# Altium schematic symbol library Infineon Power MOSFET.SchLib: 1448 symbols (part 2 of 17) (continued)
## BSD316SN
designator Q?
OptiMOS 2 Small-Signal-Transistor, 30 V VDS, 1.4 A ID, PG-SOT-363, Reel, Green; Manufacturer: Infineon; PartNumber: BSD316SN; Green: TRUE; ID (max): 1.4 A; Polarity: N; RDS (on) (max): 160 mOhm; VDS (max): 30 V; DatasheetVersion: Rev. 2.4; PackageVersion: Apr-08; PackageReference: PG-SOT-363; PackageDescription: 6-Pin Small Outline Transistor Package, 2 x 1.25 mm Body, 0.65 mm Pitch; Halogen-free: TRUE; Packing: Reel; Mounting Technology: Surface Mount; ComponentLink1Description: Manufacturer URL; ComponentLink1URL: http://www.infineon.com/; ComponentLink2Description: Datasheet; ComponentLink2URL: http://www.infineon.com/dgdl/BSD316SN_Rev2.3.pdf?folderId=db3a3043156fd573011622e10b5c1f67&fileId=db3a30431add1d95011afc90c46a0521; ComponentLink3Description: Package Specification; ComponentLink3URL: http://www.infineon.com/dgdl/SOT363-Package_Overview.pdf?folderId=db3a30431936bc4b01195360bd8f3cdc&fileId=db3a30431936bc4b0119536b62bf3cf5
footprint INF-PG-SOT-363_N (SOT23, 3-Leads, Body 2x1.25mm, Pitch 0.65mm, IPC Medium Density)
footprint INF-PG-SOT-363_L (SOT23, 3-Leads, Body 2x1.25mm, Pitch 0.65mm, IPC High Density)
footprint INF-PG-SOT-363_M (SOT23, 3-Leads, Body 2x1.25mm, Pitch 0.65mm, IPC Low Density)
pins: 1 DRAIN, 2 DRAIN, 3 GATE, 4 SOURCE, 5 DRAIN, 6 DRAIN
text: 1, 2, 5, 6

## BSD816SN
designator Q?
N-Channel OptiMOS 2 Small-Signal-Transistor, 20 V VDS, 1.4 A ID, -55 to 150 degC, PG-SOT-363, Reel, Green; Manufacturer: Infineon; PartNumber: BSD816SN; Green: TRUE; ID (max): 1.4 A; IDpuls (max): 5.6 A; Ptot (max): 0.5 W; QG: 0.6 nC; RDS (on) (max): 160 mOhm; RDS (on) (max) (@1.8V): 240 mOhm; RthJA (max): 250 K/W; VDS (max): 20 V; VGS(th) (max): 0.95 V; VGS(th) (min): 0.3 V; DatasheetVersion: Rev. 2.3; PackageVersion: Apr-08; PackageReference: PG-SOT-363; PackageDescription: 6-Pin Small Outline Transistor Package, 2 x 1.25 mm Body, 0.65 mm Pitch; Halogen-free: TRUE; Packing: Reel; RDS (on) (max) (@2.5V): 160 mOhm; Mounting Technology: Surface Mount; ComponentLink1Description: Manufacturer URL; ComponentLink1URL: http://www.infineon.com/; ComponentLink2Description: Datasheet; ComponentLink2URL: http://www.infineon.com/dgdl/BSD816SN_Rev_2.3.pdf?folderId=db3a3043156fd573011622e10b5c1f67&fileId=db3a30431b0626df011b12af48627bf1; ComponentLink3Description: Package Specification; ComponentLink3URL: http://www.infineon.com/dgdl/SOT363-Package_Overview.pdf?folderId=db3a30431936bc4b01195360bd8f3cdc&fileId=db3a30431936bc4b0119536b62bf3cf5
footprint INF-PG-SOT-363_N (SOT23, 3-Leads, Body 2x1.25mm, Pitch 0.65mm, IPC Medium Density)
footprint INF-PG-SOT-363_L (SOT23, 3-Leads, Body 2x1.25mm, Pitch 0.65mm, IPC High Density)
footprint INF-PG-SOT-363_M (SOT23, 3-Leads, Body 2x1.25mm, Pitch 0.65mm, IPC Low Density)
pins: 1 DRAIN, 2 DRAIN, 3 GATE, 4 SOURCE, 5 DRAIN, 6 DRAIN
text: 1, 2, 5, 6

## BSD840N
designator Q?
N-Channel OptiMOS 2 Small-Signal-Transistor, 20 V VDS, 0.88 A ID, -55 to 150 degC, PG-SOT-363, Reel, Green; Manufacturer: Infineon; PartNumber: BSD840N; Green: TRUE; ID (max): 0.88 A; IDpuls (max): 3.5 A; Ptot (max): 0.5 W; QG: 0.26 nC; RDS (on) (max): 400 mOhm; RDS (on) (max) (@1.8V): 560 mOhm; RthJA (max): 250 K/W; VDS (max): 20 V; VGS(th) (max): 0.75 V; VGS(th) (min): 0.3 V; DatasheetVersion: Rev. 2.3; PackageVersion: Apr-08; PackageReference: PG-SOT-363; PackageDescription: 6-Pin Small Outline Transistor Package, 2 x 1.25 mm Body, 0.65 mm Pitch; Halogen-free: TRUE; Packing: Reel; RDS (on) (max) (@2.5V): 400 mOhm; Mounting Technology: Surface Mount; ComponentLink1Description: Manufacturer URL; ComponentLink1URL: http://www.infineon.com/; ComponentLink2Description: Datasheet; ComponentLink2URL: http://www.infineon.com/dgdl/BSD840N_Rev2.3_.pdf?folderId=db3a3043156fd573011622e10b5c1f67&fileId=db3a30431b0626df011b12b4486c7c02; ComponentLink3Description: Package Specification; ComponentLink3URL: http://www.infineon.com/dgdl/SOT363-Package_Overview.pdf?folderId=db3a30431936bc4b01195360bd8f3cdc&fileId=db3a30431936bc4b0119536b62bf3cf5
footprint INF-PG-SOT-363_N (SOT23, 3-Leads, Body 2x1.25mm, Pitch 0.65mm, IPC Medium Density)
footprint INF-PG-SOT-363_L (SOT23, 3-Leads, Body 2x1.25mm, Pitch 0.65mm, IPC High Density)
footprint INF-PG-SOT-363_M (SOT23, 3-Leads, Body 2x1.25mm, Pitch 0.65mm, IPC Low Density)
part A pins: 1 SOURCE, 2 GATE, 6 DRAIN
part B pins: 3 DRAIN, 4 SOURCE, 5 GATE

## BSF024N03LT3 G
designator Q?
N-Channel OptiMOS Power-MOSFET, 30 V VDS, 106 A ID, -40 to 150 degC, MG-WDSON-2-3, Reel, Green; Manufacturer: Infineon; PartNumber: BSF024N03LT3 G; Green: TRUE; ID (max): 106 A; IDpuls (max): 400 A; Polarity: N; Ptot (max): 42 W; QG: 53 nC; RDS (on) (max): 2.4 mOhm; RDS (on) (max) (@4.5V): 3.2 mOhm; Rth: 3 K/W; RthJA (max): 58 K/W; RthJC (max): 3 K/W; VDS (max): 30 V; VGS(th) (max): 2.2 V; VGS(th) (min): 1 V; DatasheetVersion: Rev. 2.1; PackageVersion: Jun-09; PackageReference: MG-WDSON-2-3; PackageDescription: 6-Pin Metal Green Very Very Thin Profile Dual Small Outline Non-Leaded Package; Supplier 1: Digi-Key; Supplier Part Number 1: BSF024N03LT3 GTR-ND; Supplier 2: Digi-Key; Supplier Part Number 2: BSF024N03LT3 GCT-ND; Supplier 3: Digi-Key; Supplier Part Number 3: BSF024N03LT3 GDKR-ND; Halogen-free: TRUE; Packing: Reel; Mounting Technology: Surface Mount; ComponentLink1Description: Manufacturer URL; ComponentLink1URL: http://www.infineon.com/; ComponentLink2Description: Datasheet; ComponentLink2URL: http://www.infineon.com/dgdl/BSF024N03LT3+G_Rev+2.1_pdf.pdf?folderId=db3a30431ddc9372011ebafa04517f8b&fileId=db3a30432239cccd012282adaadf7bc8; ComponentLink3Description: Package Specification; ComponentLink3URL: http://www.infineon.com/dgdl/MG-WDSON-2-SQ-Package_Overview.pdf?folderId=db3a30431f848401011fb7cee2b65964&fileId=db3a30431f848401011fb7f2e17b5981
footprint INF-MG-WDSON-2-3_V (WDDSON, 6-Leads, Body 4x3.83mm)
pins: 1 DRAIN, 2 DRAIN, 3 DRAIN, 4 DRAIN, 5 GATE, 6 SOURCE
text: 1, 2, 3, 4

## BSF030NE2LQ
designator Q?
N-Channel OptiMOS Power-MOSFET, 25 V VDS, 75 A ID, -40 to 150 degC, MG-WDSON-2-3, Reel, Green; Manufacturer: Infineon; PartNumber: BSF030NE2LQ; Green: TRUE; ID (max): 75 A; IDpuls (max): 300 A; Polarity: N; Ptot (max): 28 W; QG: 23 nC; RDS (on) (max): 3 mOhm; RDS (on) (max) (@4.5V): 4.1 mOhm; Rth: 4.5 K/W; RthJA (max): 58 K/W; RthJC (max): 4.5 K/W; VDS (max): 25 V; VGS(th) (max): 2 V; VGS(th) (min): 1.2 V; DatasheetVersion: Rev. 2.3; PackageVersion: Jun-09; PackageReference: MG-WDSON-2-3; PackageDescription: 6-Pin Metal Green Very Very Thin Profile Dual Small Outline Non-Leaded Package; Supplier 1: Mouser; Supplier Part Number 1: 726-BSF030NE2LQ; Supplier 2: Digi-Key; Supplier Part Number 2: BSF030NE2LQTR-ND; Supplier 3: Digi-Key; Supplier Part Number 3: BSF030NE2LQCT-ND; Supplier 4: Digi-Key; Supplier Part Number 4: BSF030NE2LQDKR-ND; Halogen-free: TRUE; Packing: Reel; Mounting Technology: Surface Mount; ComponentLink1Description: Manufacturer URL; ComponentLink1URL: http://www.infineon.com/; ComponentLink2Description: Datasheet; ComponentLink2URL: http://www.infineon.com/dgdl/BSF030NE2LQ_Rev+2.3.pdf?folderId=db3a304313b8b5a60113cee8763b02d7&fileId=db3a30432e398416012e47a8f0792588; ComponentLink3Description: Package Specification; ComponentLink3URL: http://www.infineon.com/dgdl/MG-WDSON-2-SQ-Package_Overview.pdf?folderId=db3a30431f848401011fb7cee2b65964&fileId=db3a30431f848401011fb7f2e17b5981
footprint INF-MG-WDSON-2-3_V (WDDSON, 6-Leads, Body 4x3.83mm)
pins: 1 DRAIN, 2 DRAIN, 3 DRAIN, 4 DRAIN, 5 GATE, 6 SOURCE
text: 1, 2, 3, 4

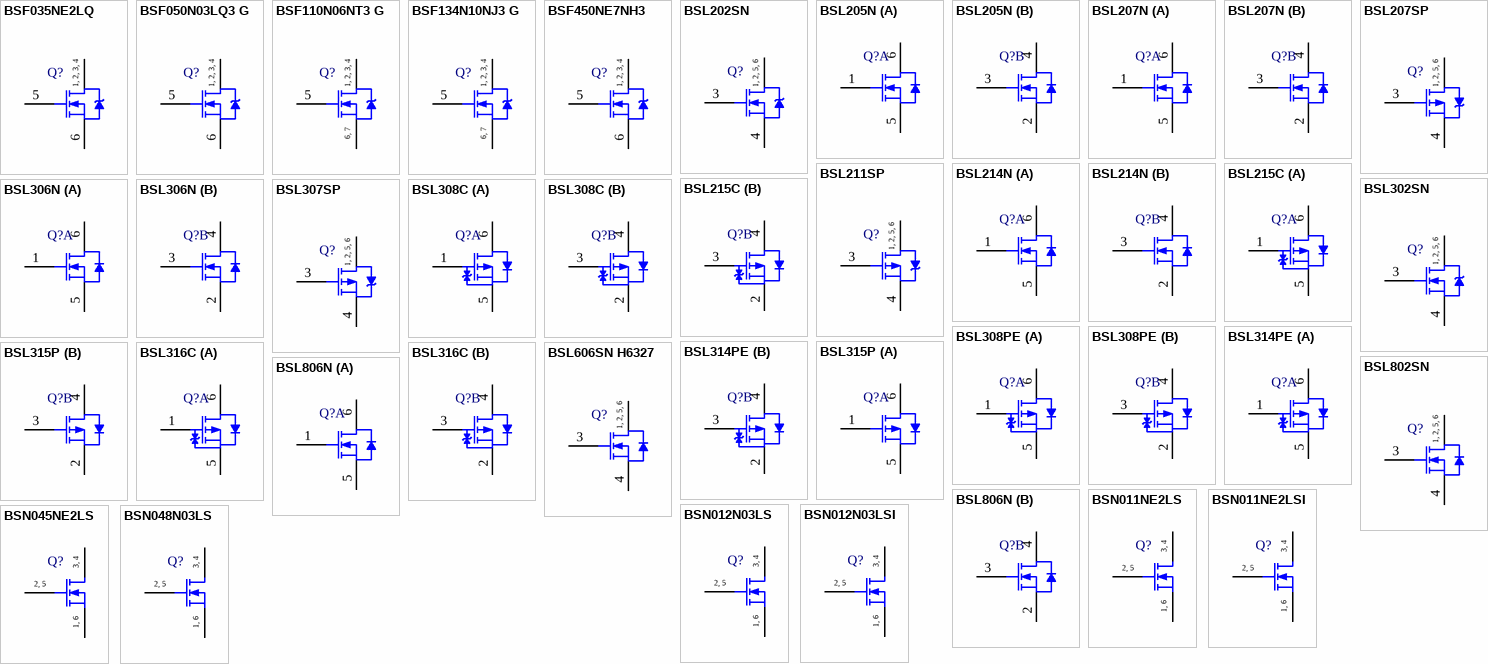
[diagram p4: symbols BSF035NE2LQ to BSN048N03LS]

## BSF035NE2LQ
designator Q?
N-Channel OptiMOS(TM) Power-MOSFET, 25 V VDS, 69 A ID, -40 to 150 degC, MG-WDSON-2, Reel, Green; Manufacturer: Infineon; PartNumber: BSF035NE2LQ; Green: TRUE; ID (max): 69 A; IDpuls (max): 276 A; Polarity: FALSE; Ptot (max): 28 W; QG: 9.1 nC; RDS (on) (max): 3.5 mOhm; RthJA (max): 58 K/W; RthJC (max): 1 K/W; VDS (max): 25 V; VGS(th) (max): 2 V; VGS(th) (min): 1.2 V; DatasheetVersion: Rev. 1.3; PackageVersion: Jun-09; PackageReference: MG-WDSON-2-3; PackageDescription: 6-Pin Metal Green Very Very Thin Profile Dual Small Outline Non-Leaded Package; Supplier 1: Mouser; Supplier Part Number 1: N/A; Halogen-free: TRUE; Packing: Reel; Technology: OptiMOS(TM); Mounting Technology: Surface Mount; ComponentLink1Description: Manufacturer URL; ComponentLink1URL: http://www.infineon.com/; ComponentLink2Description: Datasheet; ComponentLink2URL: http://www.infineon.com/dgdl/BSF035NE2LQ_rev1.3.pdf?folderId=db3a304313b8b5a60113cee8763b02d7&fileId=db3a30433f764301013f7fe8a925463c; ComponentLink3Description: Package Specification; ComponentLink3URL: http://www.infineon.com/dgdl/MG-WDSON-2-SQ-Package_Overview.pdf?folderId=db3a30431f848401011fb7cee2b65964&fileId=db3a30431f848401011fb7f2e17b5981
footprint INF-MG-WDSON-2-3_V (WDDSON, 6-Leads, Body 4x3.83mm)
pins: 1 DRAIN, 2 DRAIN, 3 DRAIN, 4 DRAIN, 5 GATE, 6 SOURCE
text: 1, 2, 3, 4

## BSF050N03LQ3 G
designator Q?
N-Channel OptiMOS Power-MOSFET, 30 V VDS, 60 A ID, -40 to 150 degC, MG-WDSON-2-3, Reel, Green; Manufacturer: Infineon; PartNumber: BSF050N03LQ3 G; Green: TRUE; ID (max): 60 A; IDpuls (max): 240 A; Polarity: N; Ptot (max): 28 W; QG: 25 nC; RDS (on) (max): 5 mOhm; RDS (on) (max) (@4.5V): 7 mOhm; Rth: 4.5 K/W; RthJA (max): 58 K/W; VDS (max): 30 V; VGS(th) (max): 2.2 V; VGS(th) (min): 1 V; DatasheetVersion: Rev. 2.2; PackageVersion: Jun-09; PackageReference: MG-WDSON-2-3; PackageDescription: 6-Pin Metal Green Very Very Thin Profile Dual Small Outline Non-Leaded Package; Supplier 1: Mouser; Supplier Part Number 1: 726-BSF050N03LQ3G; Supplier 2: Digi-Key; Supplier Part Number 2: BSF050N03LQ3 GTR-ND; Supplier 3: Digi-Key; Supplier Part Number 3: BSF050N03LQ3 GCT-ND; Supplier 4: Digi-Key; Supplier Part Number 4: BSF050N03LQ3 GDKR-ND; Halogen-free: TRUE; Packing: Reel; RthJC (max): 4.5 K/W; Mounting Technology: Surface Mount; ComponentLink1Description: Manufacturer URL; ComponentLink1URL: http://www.infineon.com/; ComponentLink2Description: Datasheet; ComponentLink2URL: http://www.infineon.com/dgdl/BSF050N03LQ3+G_Rev+2.2.pdf?folderId=db3a304313b8b5a60113cee8763b02d7&fileId=db3a304320d39d590121a0f584407b1c; ComponentLink3Description: Package Specification; ComponentLink3URL: http://www.infineon.com/dgdl/MG-WDSON-2-SQ-Package_Overview.pdf?folderId=db3a30431f848401011fb7cee2b65964&fileId=db3a30431f848401011fb7f2e17b5981
footprint INF-MG-WDSON-2-3_V (WDDSON, 6-Leads, Body 4x3.83mm)
pins: 1 DRAIN, 2 DRAIN, 3 DRAIN, 4 DRAIN, 5 GATE, 6 SOURCE
text: 1, 2, 3, 4

## BSF110N06NT3 G
designator Q?
N-Channel OptiMOS 3 Power-MOSFET, 60 V VDS, 47 A ID, -40 to 150 degC, MG-WDSON-2-4, Reel, Green; Manufacturer: Infineon; PartNumber: BSF110N06NT3 G; Green: TRUE; ID (max): 47 A; IDpuls (max): 188 A; Polarity: N; Ptot (max): 38 W; QG: 34 nC; RDS (on) (max): 11 Ohm; Rth: 1 K/W; RthJA (max): 58 K/W; VDS (max): 60 V; VGS(th) (max): 4 V; VGS(th) (min): 2 V; DatasheetVersion: Rev. 2.0; PackageVersion: Jun-09; PackageReference: MG-WDSON-2-4; PackageDescription: 7-Pin Metal Green Very Very Thin Profile Dual Small Outline Non-Leaded Package; Halogen-free: TRUE; Packing: Reel; RthJC (max): 1 K/W; Mounting Technology: Surface Mount; ComponentLink1Description: Manufacturer URL; ComponentLink1URL: http://www.infineon.com/; ComponentLink2Description: Datasheet; ComponentLink2URL: http://www.infineon.com/dgdl/BSF110N06NT3_G_rev2.pdf?folderId=db3a304313b8b5a60113cee8763b02d7&fileId=db3a3043382e837301387b92fdc80c37; ComponentLink3Description: Package Specification; ComponentLink3URL: http://www.infineon.com/dgdl/MG-WDSON-2-ST-Package_Overview.pdf?folderId=db3a30431f848401011fb8308495599c&fileId=db3a30431f848401011fb895d87a59e6
footprint INF-MG-WDSON-2-4_V (WDSON, 7-Leads, Body 4x3.83mm)
pins: 1 DRAIN, 2 DRAIN, 3 DRAIN, 4 DRAIN, 5 GATE, 6 SOURCE, 7 SOURCE
text: 1, 2, 3, 4; 6, 7

## BSF134N10NJ3 G
designator Q?
N-Channel OptiMOS Power-MOSFET, 100 V VDS, 40 A ID, -40 to 150 degC, MG-WDSON-2, Reel, Green; Manufacturer: Infineon; PartNumber: BSF134N10NJ3 G; Green: TRUE; ID (max): 40 A; IDpuls (max): 160 A; Polarity: N; Ptot (max): 43 W; QG: 23 nC; RDS (on) (max): 13.4 mOhm; Rth: 2.9 K/W; RthJA (max): 58 K/W; VDS (max): 100 V; VGS(th) (max): 3.5 V; VGS(th) (min): 2 V; DatasheetVersion: Rev. 2.5; PackageVersion: Rev. 02, 05/2009; PackageReference: MG-WDSON-2; PackageDescription: 7-Pin Metal Green Very Very Thin Profile Dual Small Outline Non-Leaded Package; Supplier 1: Mouser; Supplier Part Number 1: 726-BSF134N10NJ3G; Supplier 2: Digi-Key; Supplier Part Number 2: BSF134N10NJ3 GTR-ND; Supplier 3: Digi-Key; Supplier Part Number 3: BSF134N10NJ3 GCT-ND; Supplier 4: Digi-Key; Supplier Part Number 4: BSF134N10NJ3 GDKR-ND; Halogen-free: TRUE; Packing: Reel; RthJC (max): 2.9 K/W; Mounting Technology: Surface Mount; ComponentLink1Description: Manufacturer URL; ComponentLink1URL: http://www.infineon.com/; ComponentLink2Description: Datasheet; ComponentLink2URL: http://www.infineon.com/dgdl/BSF134N10NJ3+G_Rev+2.5.pdf?folderId=db3a304313b8b5a60113cee8763b02d7&fileId=db3a30432e779412012e7afa4a6c3834; ComponentLink3Description: Package Specification; ComponentLink3URL: http://www.infineon.com/dgdl/BSF134N10NJ3+G_Rev+2.5.pdf?folderId=db3a304313b8b5a60113cee8763b02d7&fileId=db3a30432e779412012e7afa4a6c3834
footprint INF-MG-WDSON-2-BSF134N10NJ3_V (WDSON, 7-Leads, Body 4.015x3.825mm)
pins: 1 DRAIN, 2 DRAIN, 3 DRAIN, 4 DRAIN, 5 GATE, 6 SOURCE, 7 SOURCE
text: 1, 2, 3, 4; 6, 7

## BSF450NE7NH3
designator Q?
N-Channel OptiMOS 3 Power-MOSFET, 75 V VDS, 15 A ID, -40 to 150 degC, MG-WDSON-2-1, Reel, Green; Manufacturer: Infineon; PartNumber: BSF450NE7NH3; Green: TRUE; ID (max): 15 A; IDpuls (max): 60 A; Polarity: N; Ptot (max): 18 W; QG: 6 nC; RDS (on) (max): 45 mOhm; Rth: 7 K/W; RthJA (max): 58 K/W; VDS (max): 75 V; VGS(th) (max): 3.5 V; VGS(th) (min): 2.3 V; DatasheetVersion: Rev. 2.0; PackageVersion: Rev. 02, 05/2009; PackageReference: MG-WDSON-2-1; PackageDescription: 6-Pin Metal Green Very Very Thin Profile Dual Small Outline Non-Leaded Package; Halogen-free: TRUE; Packing: Reel; RthJC (max): 7 K/W; Mounting Technology: Surface Mount; ComponentLink1Description: Manufacturer URL; ComponentLink1URL: http://www.infineon.com/; ComponentLink2Description: Datasheet; ComponentLink2URL: http://www.infineon.com/dgdl/BSF450NE7NH3G_rev2.pdf?folderId=db3a304313b8b5a60113cee8763b02d7&fileId=db3a30433a047ba0013a687e2ae403da; ComponentLink3Description: Package Specification; ComponentLink3URL: http://www.infineon.com/dgdl/BSF450NE7NH3G_rev2.0.pdf?folderId=db3a304313b8b5a60113cee8763b02d7&fileId=db3a30433a047ba0013a687e2ae403da
footprint INF-MG-WDSON-2-1_V (WDSON, 6-Leads, Body 4.015x3.825mm)
pins: 1 DRAIN, 2 DRAIN, 3 DRAIN, 4 DRAIN, 5 GATE, 6 SOURCE
text: 1, 2, 3, 4

## BSL202SN
designator Q?
N-Channel OptiMOS 2 Small-Signal-Transistor, 20 V VDS, 7.5 A ID, -55 to 150 degC, PG-TSOP-6, Reel, Green; Manufacturer: Infineon; PartNumber: BSL202SN; Green: TRUE; ID (max): 7.5 A; IDpuls (max): 30 A; Ptot (max): 2 W; QG: 5.8 nC; RDS (on) (max): 36 mOhm; RDS (on) (max) (@4.5V): 22 mOhm; VDS (max): 20 V; VGS(th) (max): 1.2 V; VGS(th) (min): 0.7 V; DatasheetVersion: Rev. 1.08; PackageReference: PG-TSOP-6; PackageDescription: 6-Pin Thin Small Outline Package, 2.9 x 1.6 mm Body, 0.95 mm Pitch; Supplier 1: Mouser; Supplier Part Number 1: N/A; Packing: Reel; RDS (on) (max) (@2.5V): 36 mOhm; Mounting Technology: Surface Mount; ComponentLink1Description: Manufacturer URL; ComponentLink1URL: http://www.infineon.com/; ComponentLink2Description: Datasheet; ComponentLink2URL: http://www.infineon.com/dgdl/BSL202SN_Rev1.08.pdf?folderId=db3a3043156fd573011622e10b5c1f67&fileId=db3a3043156fd573011622e191d41f68; ComponentLink3Description: Package Specification; ComponentLink3URL: http://www.infineon.com/cms/packages/SMD_-_Surface_Mounted_Devices/TSOP/TSOP6.html?__locale=en
footprint INF-PG-TSOP-6_N (SOP, 6-Leads, Body 2.9x1.6mm, Pitch 0.95mm, IPC Medium Density)
footprint INF-PG-TSOP-6_L (SOP, 6-Leads, Body 2.9x1.6mm, Pitch 0.95mm, IPC High Density)
footprint INF-PG-TSOP-6_M (SOP, 6-Leads, Body 2.9x1.6mm, Pitch 0.95mm, IPC Low Density)
pins: 1 DRAIN, 2 DRAIN, 3 GATE, 4 SOURCE, 5 DRAIN, 6 DRAIN
text: 1, 2, 5, 6

## BSL205N
designator Q?
N-Channel OptiMOS 2 Small-Signal-Transistor, 20 V VDS, 2.5 A ID, -55 to 150 degC, PG-TSOP-6, Reel, Green; Manufacturer: Infineon; PartNumber: BSL205N; Green: TRUE; ID (max): 2.5 A; IDpuls (max): 10 A; Ptot (max): 0.5 W; QG: 2.1 nC; RDS (on) (max): 85 mOhm; RDS (on) (max) (@4.5V): 50 mOhm; Rth: 250 K/W; VDS (max): 20 V; VGS(th) (max): 1.2 V; VGS(th) (min): 0.6 V; DatasheetVersion: Rev. 2.2; PackageReference: PG-TSOP-6; PackageDescription: 6-Pin Thin Small Outline Package, 2.9 x 1.6 mm Body, 0.95 mm Pitch; Packing: Reel; RDS (on) (max) (@2.5V): 85 mOhm; RthJA (max): 250 K/W; Mounting Technology: Surface Mount; ComponentLink1Description: Manufacturer URL; ComponentLink1URL: http://www.infineon.com/; ComponentLink2Description: Datasheet; ComponentLink2URL: http://www.infineon.com/dgdl/BSL205N_Rev2.2.pdf?folderId=db3a3043163797a6011637c252b10018&fileId=db3a30431add1d95011aedf84c5d0344; ComponentLink3Description: Package Specification; ComponentLink3URL: http://www.infineon.com/cms/packages/SMD_-_Surface_Mounted_Devices/TSOP/TSOP6.html?__locale=en
footprint INF-PG-TSOP-6_N (SOP, 6-Leads, Body 2.9x1.6mm, Pitch 0.95mm, IPC Medium Density)
footprint INF-PG-TSOP-6_L (SOP, 6-Leads, Body 2.9x1.6mm, Pitch 0.95mm, IPC High Density)
footprint INF-PG-TSOP-6_M (SOP, 6-Leads, Body 2.9x1.6mm, Pitch 0.95mm, IPC Low Density)
part A pins: 1 GATE, 5 SOURCE, 6 DRAIN
part B pins: 2 SOURCE, 3 GATE, 4 DRAIN

## BSL207N
designator Q?
N-Channel OptiMOS 2 Small-Signal-Transistor, 20 V VDS, 2.1 A ID, -55 to 150 degC, PG-TSOP-6, Reel, Green; Manufacturer: Infineon; PartNumber: BSL207N; Green: TRUE; ID (max): 2.1 A; IDpuls (max): 8.4 A; Ptot (max): 0.5 W; QG: 2.1 nC; RDS (on) (max): 110 mOhm; RDS (on) (max) (@4.5V): 70 mOhm; RthJA (max): 250 K/W; VDS (max): 20 V; VGS(th) (max): 1.2 V; VGS(th) (min): 0.7 V; DatasheetVersion: Rev. 2.2; PackageReference: PG-TSOP-6; PackageDescription: 6-Pin Thin Small Outline Package, 2.9 x 1.6 mm Body, 0.95 mm Pitch; Packing: Reel; RDS (on) (max) (@2.5V): 110 mOhm; Mounting Technology: Surface Mount; ComponentLink1Description: Manufacturer URL; ComponentLink1URL: http://www.infineon.com/; ComponentLink2Description: Datasheet; ComponentLink2URL: http://www.infineon.com/dgdl/BSL207N_Rev2.2.pdf?folderId=db3a3043156fd573011622e10b5c1f67&fileId=db3a30431add1d95011aee15c15b0376; ComponentLink3Description: Package Specification; ComponentLink3URL: http://www.infineon.com/cms/packages/SMD_-_Surface_Mounted_Devices/TSOP/TSOP6.html?__locale=en
footprint INF-PG-TSOP-6_N (SOP, 6-Leads, Body 2.9x1.6mm, Pitch 0.95mm, IPC Medium Density)
footprint INF-PG-TSOP-6_L (SOP, 6-Leads, Body 2.9x1.6mm, Pitch 0.95mm, IPC High Density)
footprint INF-PG-TSOP-6_M (SOP, 6-Leads, Body 2.9x1.6mm, Pitch 0.95mm, IPC Low Density)
part A pins: 1 GATE, 5 SOURCE, 6 DRAIN
part B pins: 2 SOURCE, 3 GATE, 4 DRAIN

## BSL207SP
designator Q?
OptiMOS-P Small-Signal-Transistor, -20 V VDS, -6 A ID, P-TSOP6-6, Reel, Green; Manufacturer: Infineon; PartNumber: BSL207SP; Green: TRUE; ID (max): -6 A; Polarity: P; VDS (max): -20 V; DatasheetVersion: Rev. 2.04; PackageReference: P-TSOP6-6; PackageDescription: 6-Pin Thin Small Outline Package, 2.9 x 1.6 mm Body, 0.95 mm Pitch; Supplier 1: Mouser; Supplier Part Number 1: N/A; Supplier 2: Digi-Key; Supplier Part Number 2: BSL207SPINTR-ND; Supplier 3: Digi-Key; Supplier Part Number 3: BSL207SPINCT-ND; Halogen-free: FALSE; Packing: Reel; Mounting Technology: Surface Mount; ComponentLink1Description: Manufacturer URL; ComponentLink1URL: http://www.infineon.com/; ComponentLink2Description: Datasheet; ComponentLink2URL: http://www.infineon.com/dgdl/BSL207SP_Rev24.pdf?folderId=db3a304412b407950112b408e8c90004&fileId=db3a304412b407950112b42af4ec442f; ComponentLink3Description: Package Specification; ComponentLink3URL: http://www.infineon.com/cms/packages/SMD_-_Surface_Mounted_Devices/TSOP/TSOP6.html?__locale=en
footprint INF-P-TSOP6-6_N (SOP, 6-Leads, Body 2.9x1.6mm, Pitch 0.95mm, IPC Medium Density)
footprint INF-P-TSOP6-6_L (SOP, 6-Leads, Body 2.9x1.6mm, Pitch 0.95mm, IPC High Density)
footprint INF-P-TSOP6-6_M (SOP, 6-Leads, Body 2.9x1.6mm, Pitch 0.95mm, IPC Low Density)
pins: 1 DRAIN, 2 DRAIN, 3 GATE, 4 SOURCE, 5 DRAIN, 6 DRAIN
text: 1, 2, 5, 6

## BSL211SP
designator Q?
OptiMOS-P Small-Signal-Transistor, -20 V VDS, -4.7 A ID, P-TSOP6-6, Reel, Green; Manufacturer: Infineon; PartNumber: BSL211SP; Green: TRUE; ID (max): -4.7 A; Polarity: P; VDS (max): -20 V; DatasheetVersion: Rev. 1.3; PackageReference: P-TSOP6-6; PackageDescription: 6-Pin Thin Small Outline Package, 2.9 x 1.6 mm Body, 0.95 mm Pitch; Supplier 1: Mouser; Supplier Part Number 1: 726-BSL211SP; Supplier 2: Digi-Key; Supplier Part Number 2: BSL211SPINTR-ND; Supplier 3: Digi-Key; Supplier Part Number 3: BSL211SPINCT-ND; Halogen-free: FALSE; Packing: Reel; Mounting Technology: Surface Mount; ComponentLink1Description: Manufacturer URL; ComponentLink1URL: http://www.infineon.com/; ComponentLink2Description: Datasheet; ComponentLink2URL: http://www.infineon.com/dgdl/BSL211SP_Rev1.3.pdf?folderId=db3a304412b407950112b408e8c90004&fileId=db3a304412b407950112b42af1e2442b; ComponentLink3Description: Package Specification; ComponentLink3URL: http://www.infineon.com/cms/packages/SMD_-_Surface_Mounted_Devices/TSOP/TSOP6.html?__locale=en
footprint INF-P-TSOP6-6_N (SOP, 6-Leads, Body 2.9x1.6mm, Pitch 0.95mm, IPC Medium Density)
footprint INF-P-TSOP6-6_L (SOP, 6-Leads, Body 2.9x1.6mm, Pitch 0.95mm, IPC High Density)
footprint INF-P-TSOP6-6_M (SOP, 6-Leads, Body 2.9x1.6mm, Pitch 0.95mm, IPC Low Density)
pins: 1 DRAIN, 2 DRAIN, 3 GATE, 4 SOURCE, 5 DRAIN, 6 DRAIN
text: 1, 2, 5, 6

## BSL214N
designator Q?
N-Channel OptiMOS 2 Small-Signal-Transistor, 20 V VDS, 1.5 A ID, -55 to 150 degC, PG-TSOP-6, Reel, Green; Manufacturer: Infineon; PartNumber: BSL214N; Green: TRUE; ID (max): 1.5 A; IDpuls (max): 6 A; Ptot (max): 0.5 W; QG: 0.8 nC; RDS (on) (max): 250 mOhm; RDS (on) (max) (@4.5V): 140 mOhm; RthJA (max): 250 K/W; VDS (max): 20 V; VGS(th) (max): 1.2 V; VGS(th) (min): 0.7 V; DatasheetVersion: Rev. 2.2; PackageReference: PG-TSOP-6; PackageDescription: 6-Pin Thin Small Outline Package, 2.9 x 1.6 mm Body, 0.95 mm Pitch; Packing: Reel; RDS (on) (max) (@2.5V): 250 mOhm; Mounting Technology: Surface Mount; ComponentLink1Description: Manufacturer URL; ComponentLink1URL: http://www.infineon.com/; ComponentLink2Description: Datasheet; ComponentLink2URL: http://www.infineon.com/dgdl/BSL214N_Rev2.2.pdf?folderId=db3a3043156fd573011622e10b5c1f67&fileId=db3a30431add1d95011afc5baa4504c2; ComponentLink3Description: Package Specification; ComponentLink3URL: http://www.infineon.com/cms/packages/SMD_-_Surface_Mounted_Devices/TSOP/TSOP6.html?__locale=en
footprint INF-PG-TSOP-6_N (SOP, 6-Leads, Body 2.9x1.6mm, Pitch 0.95mm, IPC Medium Density)
footprint INF-PG-TSOP-6_L (SOP, 6-Leads, Body 2.9x1.6mm, Pitch 0.95mm, IPC High Density)
footprint INF-PG-TSOP-6_M (SOP, 6-Leads, Body 2.9x1.6mm, Pitch 0.95mm, IPC Low Density)
part A pins: 1 GATE, 5 SOURCE, 6 DRAIN
part B pins: 2 SOURCE, 3 GATE, 4 DRAIN

## BSL215C
designator Q?
OptiMOS 2 + OptiMOS P2 Small-Signal-Transistor, 20 V, -20V VDS, 1.5 A, -1.5 A ID, -55 to 150 degC, PG-TSOP-6, Reel, Green; Manufacturer: Infineon; PartNumber: BSL215C; Green: TRUE; ID (max): 1.5 A -1.5 A; IDpuls (max): 6 A -6 A; Mode: Enhancement; Ptot< (max): 0.5 W 0.5 W; QG: 0.73 nC -3 nC; RDS (on) (max) (@2.5V): 250 mOhm 280 mOhm; RDS (on) (max) (@4.5V): 140 mOhm 150 mOhm; VDS (max): 20 V -20V; VGS(th) (max): 1.2 V -0.6 V; VGS(th) (min): 0.7 V -1.2 V; DatasheetVersion: Rev. 2.1; PackageReference: PG-TSOP-6; PackageDescription: 6-Pin Thin Small Outline Package, 2.9 x 1.6 mm Body, 0.95 mm Pitch; Packing: Reel; RDS (on)< (max): 250 mOhm 280 mOhm; Technology: OptiMOS-2; Mounting Technology: Surface Mount; ComponentLink1Description: Manufacturer URL; ComponentLink1URL: http://www.infineon.com/; ComponentLink2Description: Datasheet; ComponentLink2URL: http://www.infineon.com/dgdl/BSL215C_rev2.1.pdf?folderId=db3a30431add1d95011aed428f2d0285&fileId=db3a30431add1d95011aed4394210289; ComponentLink3Description: Package Specification; ComponentLink3URL: http://www.infineon.com/cms/packages/SMD_-_Surface_Mounted_Devices/TSOP/TSOP6.html?__locale=en
footprint INF-PG-TSOP-6_N (SOP, 6-Leads, Body 2.9x1.6mm, Pitch 0.95mm, IPC Medium Density)
footprint INF-PG-TSOP-6_L (SOP, 6-Leads, Body 2.9x1.6mm, Pitch 0.95mm, IPC High Density)
footprint INF-PG-TSOP-6_M (SOP, 6-Leads, Body 2.9x1.6mm, Pitch 0.95mm, IPC Low Density)
part A pins: 1 GATE, 5 SOURCE, 6 DRAIN
part B pins: 2 SOURCE, 3 GATE, 4 DRAIN

## BSL302SN
designator Q?
N-Channel OptiMOS 2 Small-Signal-Transistor, 30 V VDS, 7.1 A ID, -55 to 150 degC, PG-TSOP-6, Reel, Green; Manufacturer: Infineon; PartNumber: BSL302SN; Green: TRUE; ID (max): 7.1 A; IDpuls (max): 28 A; Ptot (max): 2 W; QG: 4.4 nC; RDS (on) (max): 25 mOhm; RDS (on) (max) (@4.5V): 38 mOhm; VDS (max): 30 V; VGS(th) (max): 2 V; VGS(th) (min): 1.2 V; DatasheetVersion: Rev. 1.07; PackageReference: PG-TSOP-6; PackageDescription: 6-Pin Thin Small Outline Package, 2.9 x 1.6 mm Body, 0.95 mm Pitch; Supplier 1: Mouser; Supplier Part Number 1: N/A; Packing: Reel; Mounting Technology: Surface Mount; ComponentLink1Description: Manufacturer URL; ComponentLink1URL: http://www.infineon.com/; ComponentLink2Description: Datasheet; ComponentLink2URL: http://www.infineon.com/dgdl/BSL302SN_Rev1.07.pdf?folderId=db3a3043156fd573011622e10b5c1f67&fileId=db3a3043156fd573011622e9b2061f88; ComponentLink3Description: Package Specification; ComponentLink3URL: http://www.infineon.com/cms/packages/SMD_-_Surface_Mounted_Devices/TSOP/TSOP6.html?__locale=en
footprint INF-PG-TSOP-6_N (SOP, 6-Leads, Body 2.9x1.6mm, Pitch 0.95mm, IPC Medium Density)
footprint INF-PG-TSOP-6_L (SOP, 6-Leads, Body 2.9x1.6mm, Pitch 0.95mm, IPC High Density)
footprint INF-PG-TSOP-6_M (SOP, 6-Leads, Body 2.9x1.6mm, Pitch 0.95mm, IPC Low Density)
pins: 1 DRAIN, 2 DRAIN, 3 GATE, 4 SOURCE, 5 DRAIN, 6 DRAIN
text: 1, 2, 5, 6

## BSL306N
designator Q?
N-Channel OptiMOS 2 Small-Signal-Transistor, 30 V VDS, 2.3 A ID, -55 to 150 degC, PG-TSOP-6, Reel, Green; Manufacturer: Infineon; PartNumber: BSL306N; Green: TRUE; ID (max): 2.3 A; IDpuls (max): 9 A; Ptot (max): 0.5 W; QG: 1.6 nC; RDS (on) (max): 57 mOhm; RDS (on) (max) (@4.5V): 93 mOhm; RthJA (max): 250 K/W; VDS (max): 30 V; VGS(th) (max): 2 V; VGS(th) (min): 1.2 V; DatasheetVersion: Rev. 2.3; PackageReference: PG-TSOP-6; PackageDescription: 6-Pin Thin Small Outline Package, 2.9 x 1.6 mm Body, 0.95 mm Pitch; Packing: Reel; Mounting Technology: Surface Mount; ComponentLink1Description: Manufacturer URL; ComponentLink1URL: http://www.infineon.com/; ComponentLink2Description: Datasheet; ComponentLink2URL: http://www.infineon.com/dgdl/BSL306N_Rev2.3.pdf?folderId=db3a3043156fd573011622e10b5c1f67&fileId=db3a30431add1d95011afc80323d04f0; ComponentLink3Description: Package Specification; ComponentLink3URL: http://www.infineon.com/cms/packages/SMD_-_Surface_Mounted_Devices/TSOP/TSOP6.html?__locale=en
footprint INF-PG-TSOP-6_N (SOP, 6-Leads, Body 2.9x1.6mm, Pitch 0.95mm, IPC Medium Density)
footprint INF-PG-TSOP-6_L (SOP, 6-Leads, Body 2.9x1.6mm, Pitch 0.95mm, IPC High Density)
footprint INF-PG-TSOP-6_M (SOP, 6-Leads, Body 2.9x1.6mm, Pitch 0.95mm, IPC Low Density)
part A pins: 1 GATE, 5 SOURCE, 6 DRAIN
part B pins: 2 SOURCE, 3 GATE, 4 DRAIN

## BSL307SP
designator Q?
P-Channel OptiMOS P Small-Signal-Transistor, -30 V VDS, -5.5 A ID, -55 to 150 degC, PG-TSOP-6, Reel, Green; Manufacturer: Infineon; PartNumber: BSL307SP; Green: TRUE; ID (max): -5.5 A; IDpuls (max): -22 A; Pto t (max): 2 W; QG: -23.4 nC; RDS (on) (max): 43 mOhm; RDS (on) (max) (@4.5V): 74 mOhm; Rth: 230 K/W; VDS (max): -30 V; VGS(th) (max): -2 V; VGS(th) (min): -1 V; DatasheetVersion: Rev. 1.5; PackageReference: PG-TSOP-6; PackageDescription: 6-Pin Thin Small Outline Package, 2.9 x 1.6 mm Body, 0.95 mm Pitch; Supplier 1: Mouser; Supplier Part Number 1: N/A; Supplier 2: Digi-Key; Supplier Part Number 2: BSL307SPINTR-ND; Packing: Reel; Polarity: P; Mounting Technology: Surface Mount; ComponentLink1Description: Manufacturer URL; ComponentLink1URL: http://www.infineon.com/; ComponentLink2Description: Datasheet; ComponentLink2URL: http://www.infineon.com/dgdl/BSL307SP_Rev+1.5.pdf?folderId=db3a304412b407950112b408e8c90004&fileId=db3a304412b407950112b42af8304433; ComponentLink3Description: Package Specification; ComponentLink3URL: http://www.infineon.com/cms/packages/SMD_-_Surface_Mounted_Devices/TSOP/TSOP6.html?__locale=en
footprint INF-PG-TSOP-6_N (SOP, 6-Leads, Body 2.9x1.6mm, Pitch 0.95mm, IPC Medium Density)
footprint INF-PG-TSOP-6_L (SOP, 6-Leads, Body 2.9x1.6mm, Pitch 0.95mm, IPC High Density)
footprint INF-PG-TSOP-6_M (SOP, 6-Leads, Body 2.9x1.6mm, Pitch 0.95mm, IPC Low Density)
pins: 1 DRAIN, 2 DRAIN, 3 GATE, 4 SOURCE, 5 DRAIN, 6 DRAIN
text: 1, 2, 5, 6

## BSL308C
designator Q?
OptiMOS 3 + OptiMOS 2 Small-Signal-Transistor, -30 V VDS, 2.3 A, -2.0 A ID, -55 to 150 degC, PG-TSOP-6, Reel, Green; Manufacturer: Infineon; PartNumber: BSL308C; Green: TRUE; ID (max): 2.3 A -2.0 A; IDpuls (max): 9 A -8 A; Mode: Enhancement; Ptot< (max): 0.5 W 0.5 W; QG: 1.5 nC -5 nC; RDS (on) (max) (@4.5V): 93 mOhm 130 mOhm; RDS (on)< (max): 57 mOhm 80 mOhm; VDS (max): 30 V -30 V; VGS(th) (max): 2 V -1 V; VGS(th) (min): 1.2 V -2 V; DatasheetVersion: Rev. 2.0; PackageReference: PG-TSOP-6; PackageDescription: 6-Pin Thin Small Outline Package, 2.9 x 1.6 mm Body, 0.95 mm Pitch; Packing: Reel; Technology: OptiMOS-2; Mounting Technology: Surface Mount; ComponentLink1Description: Manufacturer URL; ComponentLink1URL: http://www.infineon.com/; ComponentLink2Description: Datasheet; ComponentLink2URL: http://www.infineon.com/dgdl/BSL308C_Rev+2+0.pdf?folderId=db3a30431add1d95011aed428f2d0285&fileId=db3a30431ff98815012060ff862e6193; ComponentLink3Description: Package Specification; ComponentLink3URL: http://www.infineon.com/cms/packages/SMD_-_Surface_Mounted_Devices/TSOP/TSOP6.html?__locale=en
footprint INF-PG-TSOP-6_N (SOP, 6-Leads, Body 2.9x1.6mm, Pitch 0.95mm, IPC Medium Density)
footprint INF-PG-TSOP-6_L (SOP, 6-Leads, Body 2.9x1.6mm, Pitch 0.95mm, IPC High Density)
footprint INF-PG-TSOP-6_M (SOP, 6-Leads, Body 2.9x1.6mm, Pitch 0.95mm, IPC Low Density)
part A pins: 1 GATE, 5 SOURCE, 6 DRAIN
part B pins: 2 SOURCE, 3 GATE, 4 DRAIN